# Altium footprint library PCBLIB.PcbLib: 775 footprints (part 15 of 49)
Each footprint in its own frame and in the unit in brackets; x right, y up, seen from the top. Pads: shape width x height; smd on the part's side, far side on the other; paste and mask are expansions set on the pad; w line width, h text height; cw(c..) or ccw(c..) is an arc to the next point about the centre after c.
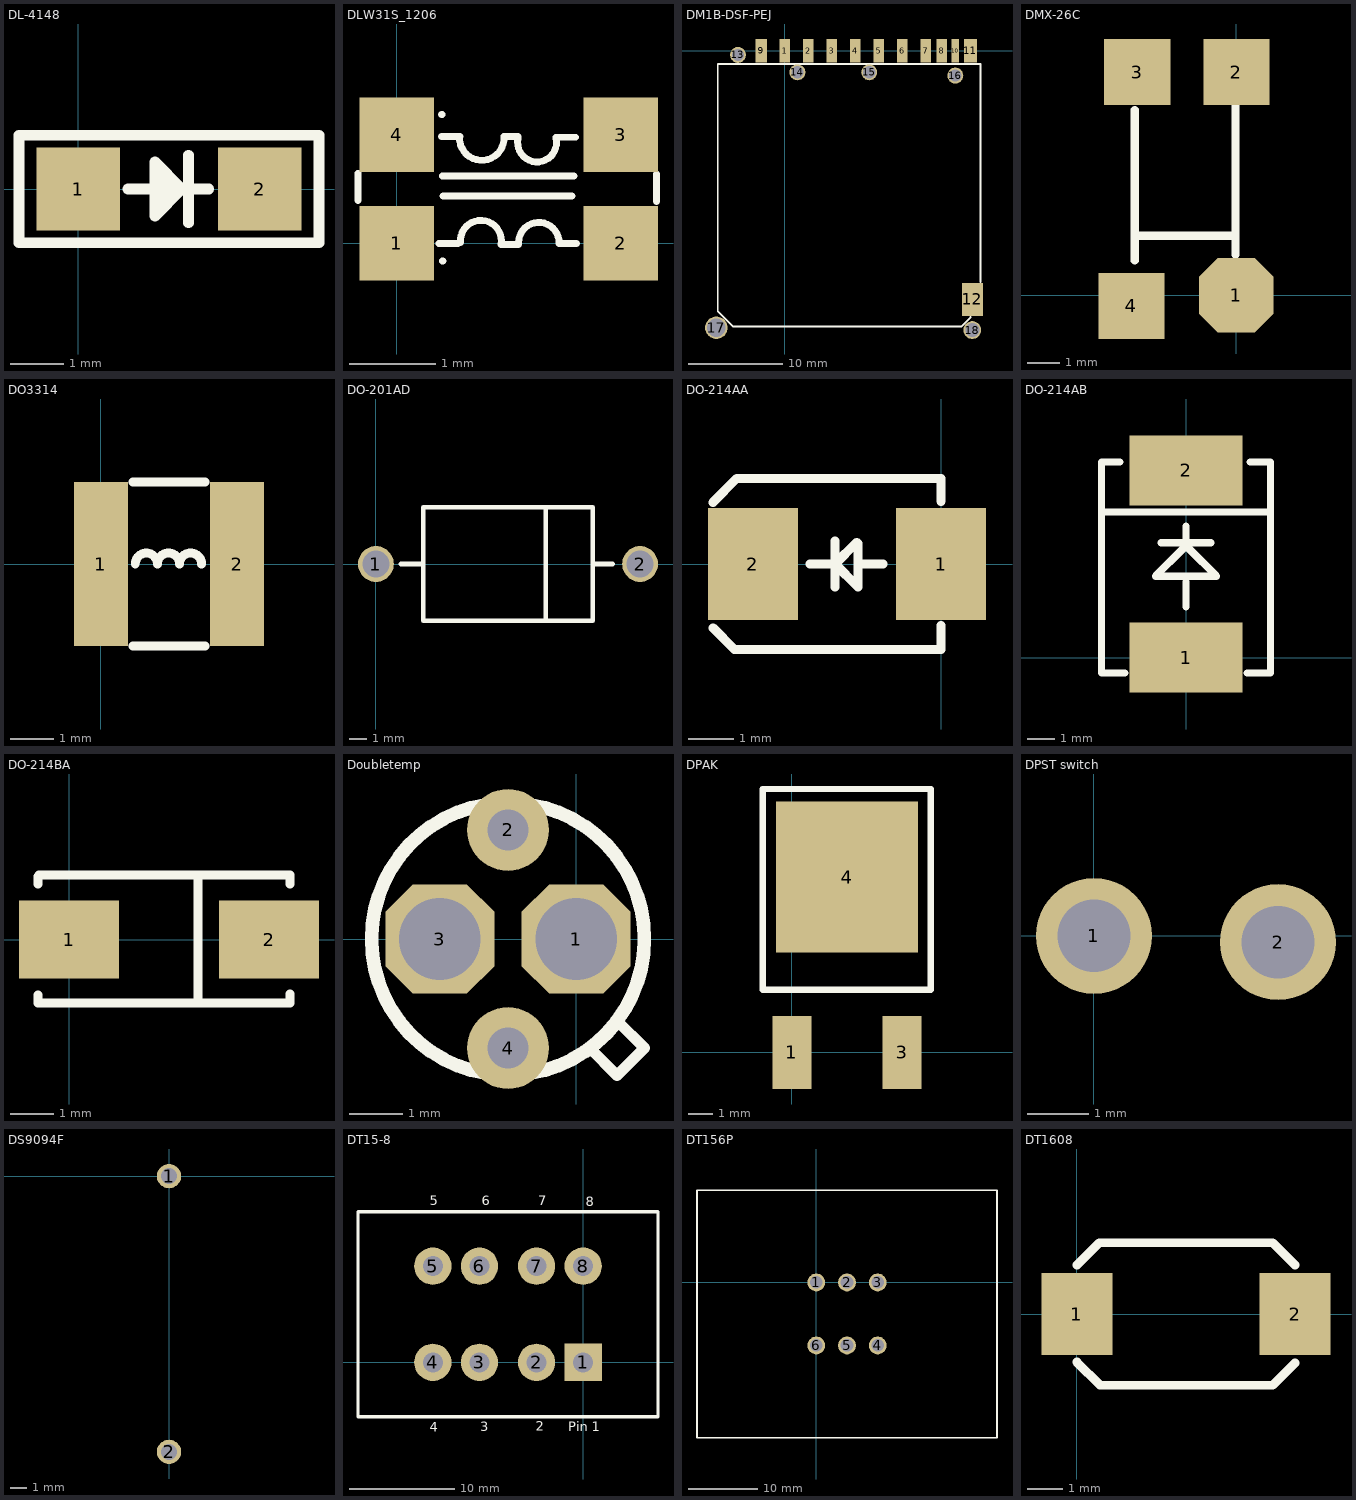
[diagram p14: the footprints below, top view; thin cyan lines are the x and y axes]

## DL-4148 [mil]
pads (2):
  rect 62x62 smd: 1(0,0) 2(135,0)
TopOverlay:
  lines w8: 37,0 57,0 ; 62,10 62,-5 62,-10 67,-5 67,5 ; 82,-25 82,25 ; 97,0 57,0 ; 57,0 57,-20 77,0 57,20 57,0 ; -44,-40 -44,40 140,40 145,40 179,40 179,-40 145,-40 -44,-40
Mechanical4:
  text ".095" at -35,0 h1
  text ".1" at 135,0 h1

## DLW31S_1206 [mm]
height 1.9
pads (4):
  rect 0.864x0.864 smd: 1(0,0) 2(2.6,0) 3(2.6,1.264) 4(0,1.264)
TopOverlay:
  lines w0.08: -0.449,0.499 -0.449,0.815 ; 0.488,0 0.712,0 ; 0.519,1.243 0.733,1.243 ; 0.519,1.497 0.529,1.497 ; 0.529,-0.204 0.539,-0.204 ; 0.529,0.784 2.057,0.784 ; 0.539,0.55 2.036,0.55 ; 0.73,1.238 ccw(c0.987,1.223) 1.244,1.244 ; 0.74,0.009 cw(c0.977,0.031) 1.211,-0.01 1.415,-0.01 ; 1.25,1.241 1.407,1.241 ; 1.408,1.218 ccw(c1.629,1.171) 1.849,1.22 ; 1.415,0.01 cw(c1.649,0.01) 1.883,0 2.087,0 ; 1.846,1.233 2.077,1.233 ; 3.014,0.489 3.014,0.805

## DM1B-DSF-PEJ [mm]
height 2.9
pads (18):
  rect 1.1x2.5 smd: 1(0,0) 2(2.5,0) 3(5,0) 4(7.5,0) 5(10,0) 6(12.5,0) 7(15,0) 8(16.7,0)
  rect 1.25x2.5 smd: 9(-2.52,0)
  rect 0.8x2.5 smd: 10(18.15,0)
  rect 1.4x2.5 smd: 11(19.75,0)
  rect 2.2x3.5 smd: 12(19.98,-26.48)
  round 1.7 hole 1.3: 13(-4.995,-0.45) 14(1.33,-2.3) 15(8.98,-2.3) 16(18.15,-2.65)
  round 2.4 hole 2: 17(-7.3,-29.5)
  round 1.9 hole 1.5: 18(19.959,-29.75)
TopOverlay:
  lines w0.127: -7.219,-29.718 -7.152,-29.651
  lines w0.203: 19.781,-28.372 18.772,-29.381 -5.524,-29.381 -7.152,-27.753 -7.152,-1.397 20.848,-1.397 20.848,-24.613

## DMX-26C [mil]
pads (4):
  oct 90x90 smd: 1(0,0)
  rect 80x80 smd: 2(0,270) 3(-120,270) 4(-127,-13)
TopOverlay:
  lines w10: -123,42 -123,224 ; -123,72 -1,72 ; -1,49 -1,230

## DO3314 [mil]
pads (2):
  rect 49x148 smd: 1(0,0) 2(123,0)
TopOverlay:
  lines w8: 29,-74 94,-74 ; 29,74 94,74 ; 31,0 cw(c41,0) 51,0 cw(c61,0) 71,0 cw(c81,0) 91,0

## DO-201AD [mil]
pads (2):
  round 79 hole 59: 1(0,0) 2(582,0)
TopOverlay:
  lines w10: 55,0 103,0 ; 374,-125 374,125 ; 477.95,0 521.65,0 ; 104,-125 104,0 104,125 478,125 478,-125 104,-125
Mechanical4:
  text ".250" at 582,0 h1

## DO-214AA [mil]
pads (2):
  rect 79x98 smd: 1(0,0) 2(-165,0)
TopOverlay:
  lines w8: -200,-56 -181,-75 -146,-75 ; -200,54 -179,75 -134,75 0,75 0,55 ; -159,-75 -128,-75 0,-75 0,-54 ; -115,0 -93,0 ; -93,-20 -93,0 ; -93,20 -93,0 ; -73,0 -51,0 ; -93,0 -74,19 -73,18 -73,-20 -93,0

## DO-214AB [mm]
pads (2):
  rect 4.07x2.52 smd: 1(0,0) 2(0,6.75)
TopOverlay:
  lines w0.254: -3.048,5.25 3.048,5.25 ; -2.39,7.06 -3.048,7.06 -3.048,-0.55 -2.2,-0.55 ; -0.9,4.125 0.9,4.125 ; -0.9,4.15 0.9,4.15 ; -0.1,3.925 -1.1,2.925 1.1,2.925 0.1,3.925 ; -0.1,3.95 -1.1,2.95 1.1,2.95 0.1,3.95 ; 0,1.825 0,2.725 ; 0,1.85 0,2.75 ; 0,4.125 0,4.725 ; 0,4.15 0,4.75 ; 2.2,-0.55 3.048,-0.55 3.048,7.06 2.31,7.06
Mechanical4:
  text ".100" at 0,0 h0.03

## DO-214BA [mil]
pads (2):
  rect 90x70 smd: 1(0,0) 2(180,0)
TopOverlay:
  lines w8: -28,-57 -28,-50 ; -28,50 -28,57 ; -27,-57 198,-57 ; -27,58 198,58 ; 116,-57 116,57 ; 199,-57 199,-49 ; 199,50 199,58

## Doubletemp [mil]
pads (4):
  oct 80x80 hole 60: 1(0,0) 3(-100,0)
  round 60 hole 30: 2(-50,80) 4(-50,-80)
TopOverlay:
  circle w10: c-50,0 r100
  lines w8: 10,-80 30,-100 50,-80 30,-60
BottomOverlay:
  circle w10: c-50,0 r100
  lines w8: 7,85 27,105 47,85 27,65
Mechanical4:
  text ".100" at 0,0 h1
  text ".110" at 0,-0.36 h1

## DPAK [mm]
height 10
pads (3):
  rect 1.6x3 smd: 1(0,0) 3(4.521,0)
  rect 5.8x6.2 smd: 4(2.261,7.188)
TopOverlay:
  lines w0.254: -1.194,2.565 5.69,2.565 5.69,10.795 -1.194,10.795 -1.194,2.565

## DPST switch [mil] "DPST switch (pushbutton)"
pads (2):
  round 75 hole 47: 1(0,0) 2(119,-4)

## DS9094F [mil]
pads (2):
  round 58 hole 38: 1(0,0) 2(0,-657)
Mechanical4:
  text "0" at 0,0 h1

## DT15-8 [mil]
height 46.97
pads (8):
  rect 140x140 hole 75: 1(0,0)
  round 140 hole 75: 2(-175,0) 3(-389,0) 4(-564,0) 5(-564,361) 6(-389,361) 7(-174.7,360.9) 8(0,361)
TopOverlay:
  lines w12: -845,-204.5 281,-204.5 281,565.5 -845,565.5 -845,-204.5
  text "8" at 10,586 h35
  text "4" at -575,-261 h35
  text "3" at -387,-259 h35
  text "2" at -178,-256 h35
  text "5" at -575,589 h35
  text "6" at -380,589 h35
  text "7" at -169,589 h35
  text "Pin 1" at -56,-258 h35

## DT156P [mil]
pads (6):
  round 102 hole 72: 1(0,0) 2(175,0) 3(350,0) 4(350,-359) 5(175,-359) 6(0,-359)
TopOverlay:
  lines w10: 1025,525 -680,525 -680,-885 1030,-885 1030,525

## DT1608 [mil]
height 110
pads (2):
  rect 80x92 smd: 1(0,0) 2(245,0)
TopOverlay:
  lines w10: 0,-54 26,-80 46,-80 199,-80 220,-80 245,-55 ; 0,55 25,80 46,80 199,80 220,80 245,55
Mechanical4:
  text ".075" at 0,0 h1